# Altium footprint library alex_footprint.PcbLib: 262 footprints (part 7 of 17)
Each footprint in its own frame and in the unit in brackets; x right, y up, seen from the top. Pads: shape width x height; smd on the part's side, far side on the other; paste and mask are expansions set on the pad; w line width, h text height; cw(c..) or ccw(c..) is an arc to the next point about the centre after c.
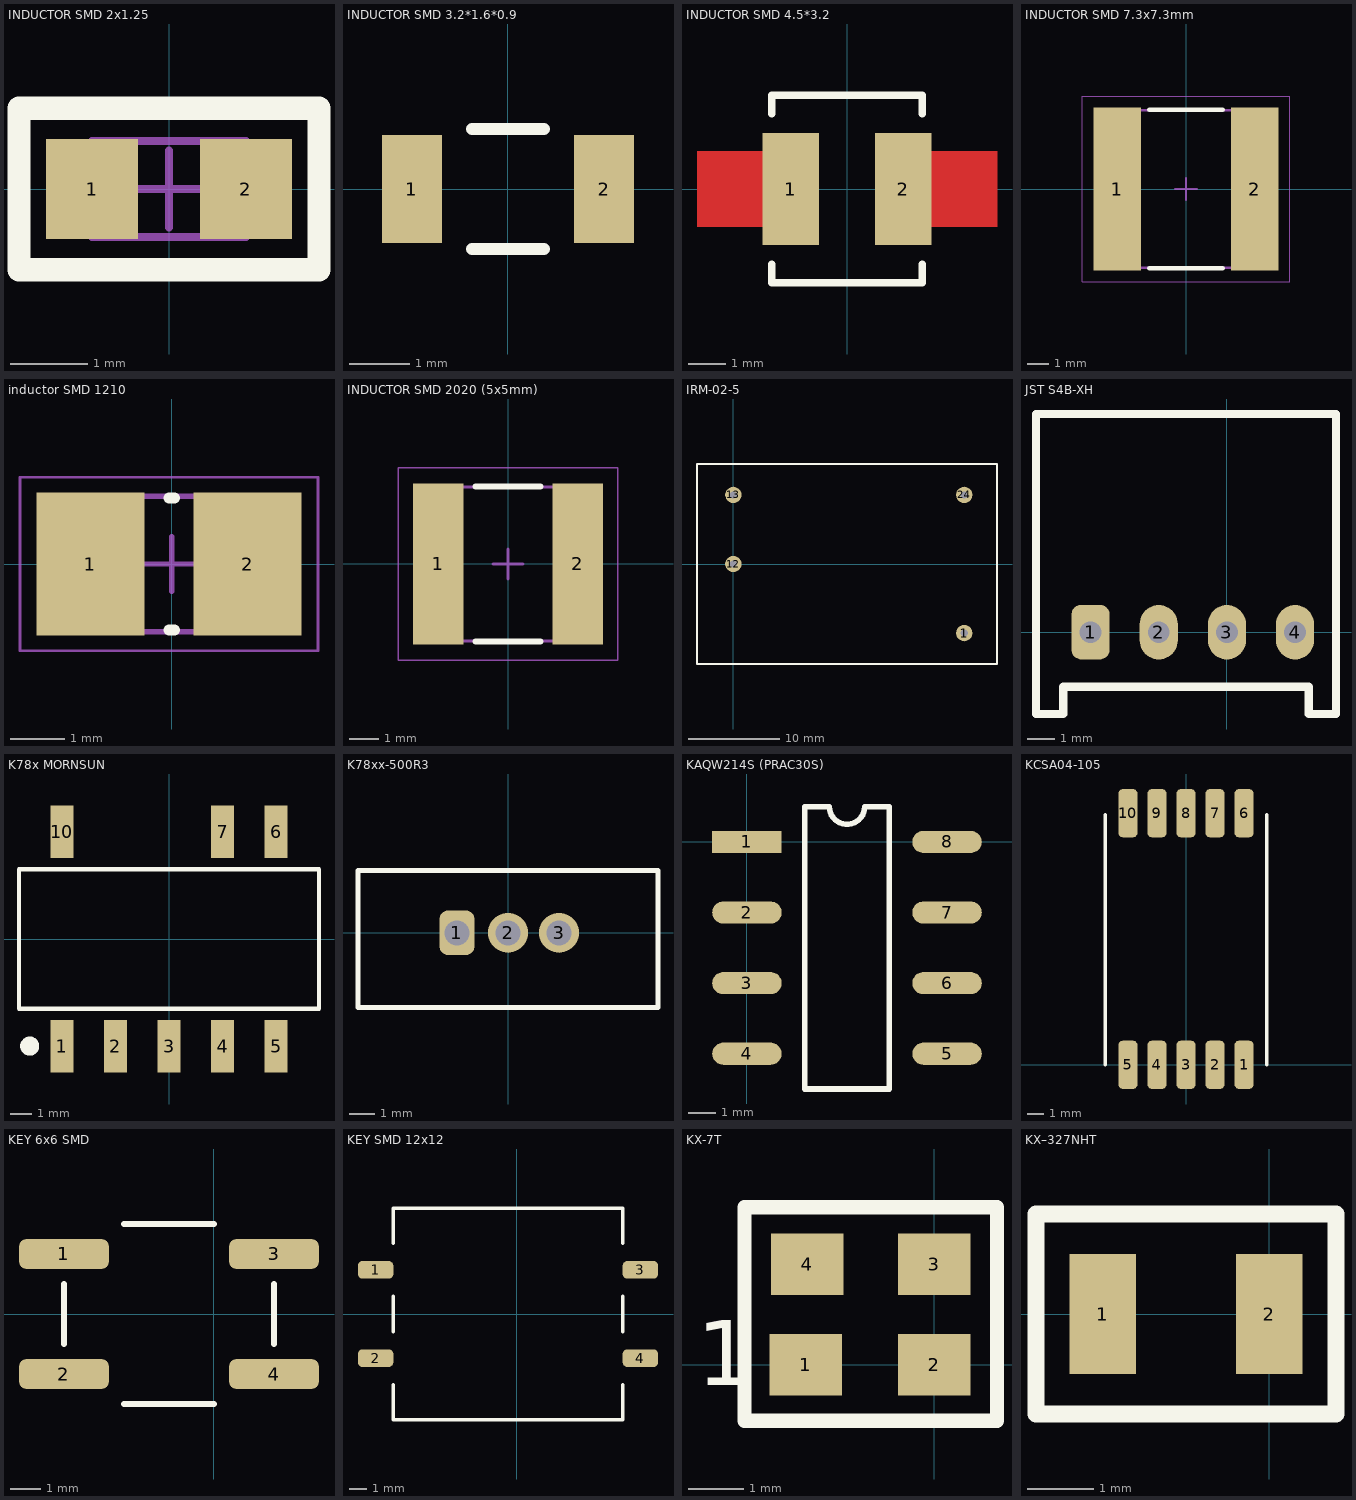
[diagram p6: the footprints below, top view; thin cyan lines are the x and y axes]

## INDUCTOR SMD 2x1.25 [mm]
height 1.25
pads (2):
  rect 1.2x1.3 smd: 1(-1,0) 2(1,0)
Top Overlay:
  lines w0.3: -1.95,-1.05 1.95,-1.05 1.95,1.05 1.35,1.05 -1.95,1.05 -1.95,-1.05
Mechanical 13:
  lines w0.1: -1,-0.625 1,-0.625 1,0.625 -1,0.625 -1,-0.625
Mechanical 15:
  lines w0.1: -0.5,0 0.5,0 ; 0,-0.5 0,0.5
3D body: height 1.25, standoff 0, extent -1,-0.625 1,0.625

## INDUCTOR SMD 3.2*1.6*0.9 [mm]
pads (2):
  rect 1x1.8 smd mask+0.25: 1(-1.6,0) 2(1.6,0)
Top Overlay:
  lines w0.2: -0.6,-1 0.6,-1 ; -0.6,1 0.6,1

## INDUCTOR SMD 4.5*3.2 [mm]
pads (2):
  rect 1.5x3 smd mask+0.35: 1(-1.5,0) 2(1.5,0)
Top Layer:
  region: -2,1 -4,1 -4,-1 -2,-1
  region: 2,1 4,1 4,-1 2,-1
Top Overlay:
  lines w0.2: -2,-2 -2,-2.5 2,-2.5 2,-2 ; -2,2 -2,2.5 2,2.5 2,2

## INDUCTOR SMD 7.3x7.3mm [mm]
height 3.2
pads (2):
  rect 2.2x7.54 smd: 1(-3.18,0) 2(3.18,0)
Top Overlay:
  lines w0.2: -1.7,-3.67 1.7,-3.67 ; -1.7,3.67 1.7,3.67
Mechanical 13:
  lines w0.1: -3.65,-3.65 -3.65,3.65 3.65,3.65 3.65,-3.65 -3.65,-3.65
Mechanical 15:
  lines w0.05: -4.8,-4.3 -4.8,4.3 4.8,4.3 4.8,-4.3 -4.8,-4.3
  lines w0.1: -0.5,0 0.5,0 ; 0,-0.5 0,0.5
3D body: height 3.2, standoff 0, extent -2.15,-3.65 2.15,3.65
3D body: height 3.2, standoff 0, extent -3.65,-3.65 -2.15,3.65
3D body: height 3.2, standoff 0, extent 2.15,-3.65 3.65,3.65

## inductor SMD 1210 [mm]
height 2
pads (2):
  rect 2x2.64 smd: 1(-1.5,0) 2(1.4,0)
Top Overlay:
  lines w0.2: -0.05,-1.22 0.05,-1.22 ; -0.05,1.22 0.05,1.22
Mechanical 13:
  lines w0.1: -1.6,-1.25 1.6,-1.25 1.6,1.25 -1.6,1.25 -1.6,-1.25
Mechanical 15:
  lines w0.05: -2.8,-1.6 2.7,-1.6 2.7,1.6 -2.8,1.6 -2.8,-1.6
  lines w0.1: -0.5,0 0.5,0 ; 0,-0.5 0,0.5
3D body: height 2, standoff 0, extent 0.55,-1.25 1.6,1.25
3D body: height 2, standoff 0, extent -1.6,-1.25 -0.55,1.25
3D body: height 2, standoff 0, extent -0.55,-1.25 0.55,1.25

## INDUCTOR SMD 2020 (5x5mm) [mm]
height 2
pads (2):
  rect 1.7x5.42 smd: 1(-2.35,0) 2(2.35,0)
Top Overlay:
  lines w0.2: -1.1,-2.61 1.1,-2.61 ; -1.1,2.61 1.1,2.61
Mechanical 13:
  lines w0.1: -2.59,-2.59 -2.59,2.59 2.59,2.59 2.59,-2.59 -2.59,-2.59
Mechanical 15:
  lines w0.05: -3.7,-3.25 -3.7,3.25 3.7,3.25 3.7,-3.25 -3.7,-3.25
  lines w0.1: -0.5,0 0.5,0 ; 0,-0.5 0,0.5
3D body: height 2, standoff 0, extent -1.57,-2.59 1.57,2.59
3D body: height 2, standoff 0, extent -2.59,-2.59 -1.57,2.59
3D body: height 2, standoff 0, extent 1.57,-2.59 2.59,2.59

## IRM-02-5 [mm]
pads (4):
  round 1.8 hole 0.8 unplated: 1(25.4,-7.6) 12(0,0) 13(0,7.6) 24(25.4,7.6)
Top Overlay:
  lines w0.2: -4,-11 -4,11 29,11 29,-11 -4,-11

## JST S4B-XH [mm]
pads (4):
  rrect50% 1.4x2 hole 0.8 unplated mask+0.2: 1(-5,0)
  oval 1.4x2 hole 0.8 unplated mask+0.2: 2(-2.5,0) 3(0,0) 4(2.5,0)
Top Overlay:
  lines w0.3: 4,-3 3,-3 3,-2 -6,-2 -6,-3 -7,-3 -7,-1 -7,8 4,8 4,-3 ; 4,-3 4,-3

## K78x MORNSUN [mm]
pads (8):
  rect 1.1x2.5 smd: 1(-5.08,-5.08) 2(-2.54,-5.08) 3(0,-5.08) 4(2.54,-5.08) 5(5.08,-5.08) 6(5.08,5.08) 7(2.54,5.08) 10(-5.08,5.08)
Top Overlay:
  circle w0.5: c-6.604,-5.08 r0.2
  lines w0.2: -7.112,-3.302 7.112,-3.302 7.112,3.302 -7.112,3.302 -7.112,-3.302

## K78xx-500R3 [mm]
pads (3):
  rrect50% 1.4x1.8 hole 1 unplated mask+0.25: 1(-2.04,0)
  round 1.6 hole 1 unplated mask+0.25: 2(0,0) 3(2.04,0)
Top Overlay:
  lines w0.2: -6,-3 -6,-2 -6,0 -6,1.5 -6,2.5 0,2.5 6,2.5 6,-3 -6,-3

## KAQW214S (PRAC30S) [mm]
pads (8):
  rect 2.5x0.8 smd: 1(0,0)
  oval 2.5x0.8 smd: 2(0,-2.54) 3(0,-5.08) 4(0,-7.62) 5(7.2,-7.62) 6(7.2,-5.08) 7(7.2,-2.54) 8(7.2,0)
Top Overlay:
  lines w0.2: 2.085,-8.89 2.085,1.27 2.965,1.27 ccw(c3.6,1.27) 4.235,1.27 5.115,1.27 5.115,-8.89 2.085,-8.89

## KCSA04-105 [mm]
pads (10):
  rrect50% 1.2x3 smd mask+0.25: 1(3.6,0) 2(1.8,0) 3(0,0) 4(-1.8,0) 5(-3.6,0) 6(3.6,15.6) 7(1.8,15.6) 8(0,15.6) 9(-1.8,15.6) 10(-3.6,15.6)
Top Overlay:
  lines w0.2: -5,0 -5,15.5 ; 5,0 5,15.5

## KEY 6x6 SMD [mm]
pads (4):
  rrect50% 3x1 smd mask+0.25: 1(-5,2) 2(-5,-2) 3(2,2) 4(2,-2)
Top Overlay:
  lines w0.2: -5,-1 -5,1 ; -3,-3 0,-3 ; -3,3 0,3 ; 2,-1 2,1

## KEY SMD 12x12 [mm]
pads (4):
  rrect50% 2x1 smd mask+0.25: 1(-8,2.5) 2(-8,-2.5) 3(7,2.5) 4(7,-2.5)
Top Overlay:
  lines w0.2: -7,-4 -7,-6 6,-6 6,-4 ; -7,-1 -7,1 ; -7,4 -7,6 6,6 6,4 ; 6,-1 6,1

## KX-7T [mm]
height 4
pads (4):
  rect 1.3x1.1 smd: 1(-2.3,0) 2(0,0) 3(0,1.8) 4(-2.275,1.8)
Top Overlay:
  lines w0.254: -3.4,-1 -3.4,-0.044 -3.4,1.869 -3.4,2.825 1.125,2.825 1.125,-1 -3.4,-1
  text "1" at -4.248,-0.75 h2

## KX–327NHT [mm]
height 4
pads (2):
  rect 1x1.8 smd: 1(-2.5,0) 2(0,0)
Top Overlay:
  lines w0.254: -3.5,-1.5 1,-1.5 1,1.5 -3.5,1.5 -3.5,-1.5